# Altium footprint library con-samtec.PCBLIB: 805 footprints (part 41 of 55) (continued)
## TSW-131-02-S-D-RA [mil] (continued)
  rectangle: 890,0 910,170
  rectangle: 990,0 1010,170
  rectangle: 1090,0 1110,170
  rectangle: 1190,0 1210,170
  rectangle: 1290,0 1310,170
  rectangle: 1390,0 1410,170
  rectangle: 1490,0 1510,170

## TSW-131-02-S-Q [mm]
pads (62):
  oct 1.5x1.5 hole 1: 1(38.1,-2.54) 2(38.1,2.54) 3(35.56,-2.54) 4(35.56,2.54) 5(33.02,-2.54) 6(33.02,2.54) 7(30.48,-2.54) 8(30.48,2.54) 9(27.94,-2.54) 10(27.94,2.54) 11(25.4,-2.54) 12(25.4,2.54) 13(22.86,-2.54) 14(22.86,2.54) 15(20.32,-2.54) 16(20.32,2.54) 17(17.78,-2.54) 18(17.78,2.54) 19(15.24,-2.54) 20(15.24,2.54) 21(12.7,-2.54) 22(12.7,2.54) 23(10.16,-2.54) 24(10.16,2.54) 25(7.62,-2.54) 26(7.62,2.54) 27(5.08,-2.54) 28(5.08,2.54) 29(2.54,-2.54) 30(2.54,2.54) 31(0,-2.54) 32(0,2.54) 33(-2.54,-2.54) 34(-2.54,2.54) 35(-5.08,-2.54) 36(-5.08,2.54) 37(-7.62,-2.54) 38(-7.62,2.54) 39(-10.16,-2.54) 40(-10.16,2.54) 41(-12.7,-2.54) 42(-12.7,2.54) 43(-15.24,-2.54) 44(-15.24,2.54) 45(-17.78,-2.54) 46(-17.78,2.54) 47(-20.32,-2.54) 48(-20.32,2.54) 49(-22.86,-2.54) 50(-22.86,2.54) 51(-25.4,-2.54) 52(-25.4,2.54) 53(-27.94,-2.54) 54(-27.94,2.54) 55(-30.48,-2.54) 56(-30.48,2.54) 57(-33.02,-2.54) 58(-33.02,2.54) 59(-35.56,-2.54) 60(-35.56,2.54) 61(-38.1,-2.54) 62(-38.1,2.54)
Top Overlay:
  lines w0.203: -39.499,-3.695 39.499,-3.695 39.499,3.695 -39.499,3.695 -39.499,-3.695
  text "1" at 37.942,-5.138 h0.94
  text "2" at 37.842,3.989 h0.94
Mechanical 16:
  rectangle: -38.45,-2.89 -37.75,-2.19
  rectangle: -38.45,2.19 -37.75,2.89
  rectangle: -35.91,-2.89 -35.21,-2.19
  rectangle: -35.91,2.19 -35.21,2.89
  rectangle: -33.37,-2.89 -32.67,-2.19
  rectangle: -33.37,2.19 -32.67,2.89
  rectangle: -30.83,-2.89 -30.13,-2.19
  rectangle: -30.83,2.19 -30.13,2.89
  rectangle: -28.29,-2.89 -27.59,-2.19
  rectangle: -28.29,2.19 -27.59,2.89
  rectangle: -25.75,-2.89 -25.05,-2.19
  rectangle: -25.75,2.19 -25.05,2.89
  rectangle: -23.21,-2.89 -22.51,-2.19
  rectangle: -23.21,2.19 -22.51,2.89
  rectangle: -20.67,-2.89 -19.97,-2.19
  rectangle: -20.67,2.19 -19.97,2.89
  rectangle: -18.13,-2.89 -17.43,-2.19
  rectangle: -18.13,2.19 -17.43,2.89
  rectangle: -15.59,-2.89 -14.89,-2.19
  rectangle: -15.59,2.19 -14.89,2.89
  rectangle: -13.05,-2.89 -12.35,-2.19
  rectangle: -13.05,2.19 -12.35,2.89
  rectangle: -10.51,-2.89 -9.81,-2.19
  rectangle: -10.51,2.19 -9.81,2.89
  rectangle: -7.97,-2.89 -7.27,-2.19
  rectangle: -7.97,2.19 -7.27,2.89
  rectangle: -5.43,-2.89 -4.73,-2.19
  rectangle: -5.43,2.19 -4.73,2.89
  rectangle: -2.89,-2.89 -2.19,-2.19
  rectangle: -2.89,2.19 -2.19,2.89
  rectangle: -0.35,-2.89 0.35,-2.19
  rectangle: -0.35,2.19 0.35,2.89
  rectangle: 2.19,-2.89 2.89,-2.19
  rectangle: 2.19,2.19 2.89,2.89
  rectangle: 4.73,-2.89 5.43,-2.19
  rectangle: 4.73,2.19 5.43,2.89
  rectangle: 7.27,-2.89 7.97,-2.19
  rectangle: 7.27,2.19 7.97,2.89
  rectangle: 9.81,-2.89 10.51,-2.19
  rectangle: 9.81,2.19 10.51,2.89
  rectangle: 12.35,-2.89 13.05,-2.19
  rectangle: 12.35,2.19 13.05,2.89
  rectangle: 14.89,-2.89 15.59,-2.19
  rectangle: 14.89,2.19 15.59,2.89
  rectangle: 17.43,-2.89 18.13,-2.19
  rectangle: 17.43,2.19 18.13,2.89
  rectangle: 19.97,-2.89 20.67,-2.19
  rectangle: 19.97,2.19 20.67,2.89
  rectangle: 22.51,-2.89 23.21,-2.19
  rectangle: 22.51,2.19 23.21,2.89
  rectangle: 25.05,-2.89 25.75,-2.19
  rectangle: 25.05,2.19 25.75,2.89
  rectangle: 27.59,-2.89 28.29,-2.19
  rectangle: 27.59,2.19 28.29,2.89
  rectangle: 30.13,-2.89 30.83,-2.19
  rectangle: 30.13,2.19 30.83,2.89
  rectangle: 32.67,-2.89 33.37,-2.19
  rectangle: 32.67,2.19 33.37,2.89
  rectangle: 35.21,-2.89 35.91,-2.19
  rectangle: 35.21,2.19 35.91,2.89
  rectangle: 37.75,-2.89 38.45,-2.19
  rectangle: 37.75,2.19 38.45,2.89

## TSW-131-02-S-Q-RA [mil]
pads (62):
  oct 59.06x59.06 hole 39.37: 1(1500,60) 2(1500,260) 3(1400,60) 4(1400,260) 5(1300,60) 6(1300,260) 7(1200,60) 8(1200,260) 9(1100,60) 10(1100,260) 11(1000,60) 12(1000,260) 13(900,60) 14(900,260) 15(800,60) 16(800,260) 17(700,60) 18(700,260) 19(600,60) 20(600,260) 21(500,60) 22(500,260) 23(400,60) 24(400,260) 25(300,60) 26(300,260) 27(200,60) 28(200,260) 29(100,60) 30(100,260) 31(0,60) 32(0,260) 33(-100,60) 34(-100,260) 35(-200,60) 36(-200,260) 37(-300,60) 38(-300,260) 39(-400,60) 40(-400,260) 41(-500,60) 42(-500,260) 43(-600,60) 44(-600,260) 45(-700,60) 46(-700,260) 47(-800,60) 48(-800,260) 49(-900,60) 50(-900,260) 51(-1000,60) 52(-1000,260) 53(-1100,60) 54(-1100,260) 55(-1200,60) 56(-1200,260) 57(-1300,60) 58(-1300,260) 59(-1400,60) 60(-1400,260) 61(-1500,60) 62(-1500,260)
Top Overlay:
  rectangle: -1510,-310.63 -1490,-80.32
  rectangle: -1410,-310.63 -1390,-80.32
  rectangle: -1310,-310.63 -1290,-80.32
  rectangle: -1210,-310.63 -1190,-80.32
  rectangle: -1110,-310.63 -1090,-80.32
  rectangle: -1010,-310.63 -990,-80.32
  rectangle: -910,-310.63 -890,-80.32
  rectangle: -810,-310.63 -790,-80.32
  rectangle: -710,-310.63 -690,-80.32
  rectangle: -610,-310.63 -590,-80.32
  rectangle: -510,-310.63 -490,-80.32
  rectangle: -410,-310.63 -390,-80.32
  rectangle: -310,-310.63 -290,-80.32
  rectangle: -210,-310.63 -190,-80.32
  rectangle: -110,-310.63 -90,-80.32
  rectangle: -10,-310.63 10,-80.32
  rectangle: 90,-310.63 110,-80.32
  rectangle: 190,-310.63 210,-80.32
  rectangle: 290,-310.63 310,-80.32
  rectangle: 390,-310.63 410,-80.32
  rectangle: 490,-310.63 510,-80.32
  rectangle: 590,-310.63 610,-80.32
  rectangle: 690,-310.63 710,-80.32
  rectangle: 790,-310.63 810,-80.32
  rectangle: 890,-310.63 910,-80.32
  rectangle: 990,-310.63 1010,-80.32
  rectangle: 1090,-310.63 1110,-80.32
  rectangle: 1190,-310.63 1210,-80.32
  rectangle: 1290,-310.63 1310,-80.32
  rectangle: 1390,-310.63 1410,-80.32
  rectangle: 1490,-310.63 1510,-80.32
  lines w8: -1555.08,-80.55 1555.08,-80.55 1555.08,-4.17 -1555.08,-4.17 -1555.08,-80.55
  text "1" at 1553.54,43.31 h36.81
  text "2" at 1551.18,242.72 h36.81
Mechanical 16:
  rectangle: -1510,0 -1490,270
  rectangle: -1410,0 -1390,270
  rectangle: -1310,0 -1290,270
  rectangle: -1210,0 -1190,270
  rectangle: -1110,0 -1090,270
  rectangle: -1010,0 -990,270
  rectangle: -910,0 -890,270
  rectangle: -810,0 -790,270
  rectangle: -710,0 -690,270
  rectangle: -610,0 -590,270
  rectangle: -510,0 -490,270
  rectangle: -410,0 -390,270
  rectangle: -310,0 -290,270
  rectangle: -210,0 -190,270
  rectangle: -110,0 -90,270
  rectangle: -10,0 10,270
  rectangle: 90,0 110,270
  rectangle: 190,0 210,270
  rectangle: 290,0 310,270
  rectangle: 390,0 410,270
  rectangle: 490,0 510,270
  rectangle: 590,0 610,270
  rectangle: 690,0 710,270
  rectangle: 790,0 810,270
  rectangle: 890,0 910,270
  rectangle: 990,0 1010,270
  rectangle: 1090,0 1110,270
  rectangle: 1190,0 1210,270
  rectangle: 1290,0 1310,270
  rectangle: 1390,0 1410,270
  rectangle: 1490,0 1510,270

## TSW-131-02-S-S [mm]
pads (31):
  oct 1.5x1.5 hole 1: 1(38.1,0) 2(35.56,0) 3(33.02,0) 4(30.48,0) 5(27.94,0) 6(25.4,0) 7(22.86,0) 8(20.32,0) 9(17.78,0) 10(15.24,0) 11(12.7,0) 12(10.16,0) 13(7.62,0) 14(5.08,0) 15(2.54,0) 16(0,0) 17(-2.54,0) 18(-5.08,0) 19(-7.62,0) 20(-10.16,0) 21(-12.7,0) 22(-15.24,0) 23(-17.78,0) 24(-20.32,0) 25(-22.86,0) 26(-25.4,0) 27(-27.94,0) 28(-30.48,0) 29(-33.02,0) 30(-35.56,0) 31(-38.1,0)
Top Overlay:
  lines w0.203: -39.499,-1.155 39.499,-1.155 39.499,1.155 -39.499,1.155 -39.499,-1.155
  text "1" at 37.842,-2.498 h0.94
Mechanical 16:
  rectangle: -38.45,-0.35 -37.75,0.35
  rectangle: -35.91,-0.35 -35.21,0.35
  rectangle: -33.37,-0.35 -32.67,0.35
  rectangle: -30.83,-0.35 -30.13,0.35
  rectangle: -28.29,-0.35 -27.59,0.35
  rectangle: -25.75,-0.35 -25.05,0.35
  rectangle: -23.21,-0.35 -22.51,0.35
  rectangle: -20.67,-0.35 -19.97,0.35
  rectangle: -18.13,-0.35 -17.43,0.35
  rectangle: -15.59,-0.35 -14.89,0.35
  rectangle: -13.05,-0.35 -12.35,0.35
  rectangle: -10.51,-0.35 -9.81,0.35
  rectangle: -7.97,-0.35 -7.27,0.35
  rectangle: -5.43,-0.35 -4.73,0.35
  rectangle: -2.89,-0.35 -2.19,0.35
  rectangle: -0.35,-0.35 0.35,0.35
  rectangle: 2.19,-0.35 2.89,0.35
  rectangle: 4.73,-0.35 5.43,0.35
  rectangle: 7.27,-0.35 7.97,0.35
  rectangle: 9.81,-0.35 10.51,0.35
  rectangle: 12.35,-0.35 13.05,0.35
  rectangle: 14.89,-0.35 15.59,0.35
  rectangle: 17.43,-0.35 18.13,0.35
  rectangle: 19.97,-0.35 20.67,0.35
  rectangle: 22.51,-0.35 23.21,0.35
  rectangle: 25.05,-0.35 25.75,0.35
  rectangle: 27.59,-0.35 28.29,0.35
  rectangle: 30.13,-0.35 30.83,0.35
  rectangle: 32.67,-0.35 33.37,0.35
  rectangle: 35.21,-0.35 35.91,0.35
  rectangle: 37.75,-0.35 38.45,0.35

## TSW-131-02-S-S-RA [mil]
pads (31):
  oct 59.06x59.06 hole 39.37: 1(1500,60) 2(1400,60) 3(1300,60) 4(1200,60) 5(1100,60) 6(1000,60) 7(900,60) 8(800,60) 9(700,60) 10(600,60) 11(500,60) 12(400,60) 13(300,60) 14(200,60) 15(100,60) 16(0,60) 17(-100,60) 18(-200,60) 19(-300,60) 20(-400,60) 21(-500,60) 22(-600,60) 23(-700,60) 24(-800,60) 25(-900,60) 26(-1000,60) 27(-1100,60) 28(-1200,60) 29(-1300,60) 30(-1400,60) 31(-1500,60)
Top Overlay:
  rectangle: -1510,-310.63 -1490,-80.32
  rectangle: -1410,-310.63 -1390,-80.32
  rectangle: -1310,-310.63 -1290,-80.32
  rectangle: -1210,-310.63 -1190,-80.32
  rectangle: -1110,-310.63 -1090,-80.32
  rectangle: -1010,-310.63 -990,-80.32
  rectangle: -910,-310.63 -890,-80.32
  rectangle: -810,-310.63 -790,-80.32
  rectangle: -710,-310.63 -690,-80.32
  rectangle: -610,-310.63 -590,-80.32
  rectangle: -510,-310.63 -490,-80.32
  rectangle: -410,-310.63 -390,-80.32
  rectangle: -310,-310.63 -290,-80.32
  rectangle: -210,-310.63 -190,-80.32
  rectangle: -110,-310.63 -90,-80.32
  rectangle: -10,-310.63 10,-80.32
  rectangle: 90,-310.63 110,-80.32
  rectangle: 190,-310.63 210,-80.32
  rectangle: 290,-310.63 310,-80.32
  rectangle: 390,-310.63 410,-80.32
  rectangle: 490,-310.63 510,-80.32
  rectangle: 590,-310.63 610,-80.32
  rectangle: 690,-310.63 710,-80.32
  rectangle: 790,-310.63 810,-80.32
  rectangle: 890,-310.63 910,-80.32
  rectangle: 990,-310.63 1010,-80.32
  rectangle: 1090,-310.63 1110,-80.32
  rectangle: 1190,-310.63 1210,-80.32
  rectangle: 1290,-310.63 1310,-80.32
  rectangle: 1390,-310.63 1410,-80.32
  rectangle: 1490,-310.63 1510,-80.32
  lines w8: -1555.08,-80.55 1555.08,-80.55 1555.08,-4.17 -1555.08,-4.17 -1555.08,-80.55
  text "1" at 1550.47,45.35 h36.81
Mechanical 16:
  rectangle: -1510,0 -1490,70
  rectangle: -1410,0 -1390,70
  rectangle: -1310,0 -1290,70
  rectangle: -1210,0 -1190,70
  rectangle: -1110,0 -1090,70
  rectangle: -1010,0 -990,70
  rectangle: -910,0 -890,70
  rectangle: -810,0 -790,70
  rectangle: -710,0 -690,70
  rectangle: -610,0 -590,70
  rectangle: -510,0 -490,70
  rectangle: -410,0 -390,70
  rectangle: -310,0 -290,70
  rectangle: -210,0 -190,70
  rectangle: -110,0 -90,70
  rectangle: -10,0 10,70
  rectangle: 90,0 110,70
  rectangle: 190,0 210,70
  rectangle: 290,0 310,70
  rectangle: 390,0 410,70
  rectangle: 490,0 510,70
  rectangle: 590,0 610,70
  rectangle: 690,0 710,70
  rectangle: 790,0 810,70
  rectangle: 890,0 910,70
  rectangle: 990,0 1010,70
  rectangle: 1090,0 1110,70
  rectangle: 1190,0 1210,70
  rectangle: 1290,0 1310,70
  rectangle: 1390,0 1410,70
  rectangle: 1490,0 1510,70

## TSW-131-02-S-T [mm]
pads (93):
  oct 1.5x1.5 hole 1: 1(38.1,-2.54) 2(38.1,0) 3(38.1,2.54) 4(35.56,-2.54) 5(35.56,0) 6(35.56,2.54) 7(33.02,-2.54) 8(33.02,0) 9(33.02,2.54) 10(30.48,-2.54) 11(30.48,0) 12(30.48,2.54) 13(27.94,-2.54) 14(27.94,0) 15(27.94,2.54) 16(25.4,-2.54) 17(25.4,0) 18(25.4,2.54) 19(22.86,-2.54) 20(22.86,0) 21(22.86,2.54) 22(20.32,-2.54) 23(20.32,0) 24(20.32,2.54) 25(17.78,-2.54) 26(17.78,0) 27(17.78,2.54) 28(15.24,-2.54) 29(15.24,0) 30(15.24,2.54) 31(12.7,-2.54) 32(12.7,0) 33(12.7,2.54) 34(10.16,-2.54) 35(10.16,0) 36(10.16,2.54) 37(7.62,-2.54) 38(7.62,0) 39(7.62,2.54) 40(5.08,-2.54) 41(5.08,0) 42(5.08,2.54) 43(2.54,-2.54) 44(2.54,0) 45(2.54,2.54) 46(0,-2.54) 47(0,0) 48(0,2.54) 49(-2.54,-2.54) 50(-2.54,0) 51(-2.54,2.54) 52(-5.08,-2.54) 53(-5.08,0) 54(-5.08,2.54) 55(-7.62,-2.54) 56(-7.62,0) 57(-7.62,2.54) 58(-10.16,-2.54) 59(-10.16,0) 60(-10.16,2.54) 61(-12.7,-2.54) 62(-12.7,0) 63(-12.7,2.54) 64(-15.24,-2.54) 65(-15.24,0) 66(-15.24,2.54) 67(-17.78,-2.54) 68(-17.78,0) 69(-17.78,2.54) 70(-20.32,-2.54) 71(-20.32,0) 72(-20.32,2.54) 73(-22.86,-2.54) 74(-22.86,0) 75(-22.86,2.54) 76(-25.4,-2.54) 77(-25.4,0) 78(-25.4,2.54) 79(-27.94,-2.54) 80(-27.94,0) 81(-27.94,2.54) 82(-30.48,-2.54) 83(-30.48,0) 84(-30.48,2.54) 85(-33.02,-2.54) 86(-33.02,0) 87(-33.02,2.54) 88(-35.56,-2.54) 89(-35.56,0) 90(-35.56,2.54) 91(-38.1,-2.54) 92(-38.1,0) 93(-38.1,2.54)
Top Overlay:
  lines w0.203: -39.499,-3.695 39.499,-3.695 39.499,3.695 -39.499,3.695 -39.499,-3.695
  text "1" at 37.792,-5.188 h0.94
  text "3" at 37.788,3.989 h0.94
Mechanical 16:
  rectangle: -38.45,-2.89 -37.75,-2.19
  rectangle: -38.45,-0.35 -37.75,0.35
  rectangle: -38.45,2.19 -37.75,2.89
  rectangle: -35.91,-2.89 -35.21,-2.19
  rectangle: -35.91,-0.35 -35.21,0.35
  rectangle: -35.91,2.19 -35.21,2.89
  rectangle: -33.37,-2.89 -32.67,-2.19
  rectangle: -33.37,-0.35 -32.67,0.35
  rectangle: -33.37,2.19 -32.67,2.89
  rectangle: -30.83,-2.89 -30.13,-2.19
  rectangle: -30.83,-0.35 -30.13,0.35
  rectangle: -30.83,2.19 -30.13,2.89
  rectangle: -28.29,-2.89 -27.59,-2.19
  rectangle: -28.29,-0.35 -27.59,0.35
  rectangle: -28.29,2.19 -27.59,2.89
  rectangle: -25.75,-2.89 -25.05,-2.19
  rectangle: -25.75,-0.35 -25.05,0.35
  rectangle: -25.75,2.19 -25.05,2.89
  rectangle: -23.21,-2.89 -22.51,-2.19
  rectangle: -23.21,-0.35 -22.51,0.35
  rectangle: -23.21,2.19 -22.51,2.89
  rectangle: -20.67,-2.89 -19.97,-2.19
  rectangle: -20.67,-0.35 -19.97,0.35
  rectangle: -20.67,2.19 -19.97,2.89
  rectangle: -18.13,-2.89 -17.43,-2.19
  rectangle: -18.13,-0.35 -17.43,0.35
  rectangle: -18.13,2.19 -17.43,2.89
  rectangle: -15.59,-2.89 -14.89,-2.19
  rectangle: -15.59,-0.35 -14.89,0.35
  rectangle: -15.59,2.19 -14.89,2.89
  rectangle: -13.05,-2.89 -12.35,-2.19
  rectangle: -13.05,-0.35 -12.35,0.35
  rectangle: -13.05,2.19 -12.35,2.89
  rectangle: -10.51,-2.89 -9.81,-2.19
  rectangle: -10.51,-0.35 -9.81,0.35
  rectangle: -10.51,2.19 -9.81,2.89
  rectangle: -7.97,-2.89 -7.27,-2.19
  rectangle: -7.97,-0.35 -7.27,0.35
  rectangle: -7.97,2.19 -7.27,2.89
  rectangle: -5.43,-2.89 -4.73,-2.19
  rectangle: -5.43,-0.35 -4.73,0.35
  rectangle: -5.43,2.19 -4.73,2.89
  rectangle: -2.89,-2.89 -2.19,-2.19
  rectangle: -2.89,-0.35 -2.19,0.35
  rectangle: -2.89,2.19 -2.19,2.89
  rectangle: -0.35,-2.89 0.35,-2.19
  rectangle: -0.35,-0.35 0.35,0.35
  rectangle: -0.35,2.19 0.35,2.89
  rectangle: 2.19,-2.89 2.89,-2.19
  rectangle: 2.19,-0.35 2.89,0.35
  rectangle: 2.19,2.19 2.89,2.89
  rectangle: 4.73,-2.89 5.43,-2.19
  rectangle: 4.73,-0.35 5.43,0.35
  rectangle: 4.73,2.19 5.43,2.89
  rectangle: 7.27,-2.89 7.97,-2.19
  rectangle: 7.27,-0.35 7.97,0.35
  rectangle: 7.27,2.19 7.97,2.89
  rectangle: 9.81,-2.89 10.51,-2.19
  rectangle: 9.81,-0.35 10.51,0.35
  rectangle: 9.81,2.19 10.51,2.89
  rectangle: 12.35,-2.89 13.05,-2.19
  rectangle: 12.35,-0.35 13.05,0.35
  rectangle: 12.35,2.19 13.05,2.89
  rectangle: 14.89,-2.89 15.59,-2.19
  rectangle: 14.89,-0.35 15.59,0.35
  rectangle: 14.89,2.19 15.59,2.89
  rectangle: 17.43,-2.89 18.13,-2.19
  rectangle: 17.43,-0.35 18.13,0.35
  rectangle: 17.43,2.19 18.13,2.89
  rectangle: 19.97,-2.89 20.67,-2.19
  rectangle: 19.97,-0.35 20.67,0.35
  rectangle: 19.97,2.19 20.67,2.89
  rectangle: 22.51,-2.89 23.21,-2.19
  rectangle: 22.51,-0.35 23.21,0.35
  rectangle: 22.51,2.19 23.21,2.89
  rectangle: 25.05,-2.89 25.75,-2.19
  rectangle: 25.05,-0.35 25.75,0.35
  rectangle: 25.05,2.19 25.75,2.89
  rectangle: 27.59,-2.89 28.29,-2.19
  rectangle: 27.59,-0.35 28.29,0.35
  rectangle: 27.59,2.19 28.29,2.89
  rectangle: 30.13,-2.89 30.83,-2.19
  rectangle: 30.13,-0.35 30.83,0.35
  rectangle: 30.13,2.19 30.83,2.89
  rectangle: 32.67,-2.89 33.37,-2.19
  rectangle: 32.67,-0.35 33.37,0.35
  rectangle: 32.67,2.19 33.37,2.89
  rectangle: 35.21,-2.89 35.91,-2.19
  rectangle: 35.21,-0.35 35.91,0.35
  rectangle: 35.21,2.19 35.91,2.89
  rectangle: 37.75,-2.89 38.45,-2.19
  rectangle: 37.75,-0.35 38.45,0.35
  rectangle: 37.75,2.19 38.45,2.89

## TSW-131-02-S-T-RA [mil]
pads (93):
  oct 59.06x59.06 hole 39.37: 1(1500,60) 2(1500,160) 3(1500,260) 4(1400,60) 5(1400,160) 6(1400,260) 7(1300,60) 8(1300,160) 9(1300,260) 10(1200,60) 11(1200,160) 12(1200,260) 13(1100,60) 14(1100,160) 15(1100,260) 16(1000,60) 17(1000,160) 18(1000,260) 19(900,60) 20(900,160) 21(900,260) 22(800,60) 23(800,160) 24(800,260) 25(700,60) 26(700,160) 27(700,260) 28(600,60) 29(600,160) 30(600,260) 31(500,60) 32(500,160) 33(500,260) 34(400,60) 35(400,160) 36(400,260) 37(300,60) 38(300,160) 39(300,260) 40(200,60) 41(200,160) 42(200,260) 43(100,60) 44(100,160) 45(100,260) 46(0,60) 47(0,160) 48(0,260) 49(-100,60) 50(-100,160) 51(-100,260) 52(-200,60) 53(-200,160) 54(-200,260) 55(-300,60) 56(-300,160) 57(-300,260) 58(-400,60) 59(-400,160) 60(-400,260) 61(-500,60) 62(-500,160) 63(-500,260) 64(-600,60) 65(-600,160) 66(-600,260) 67(-700,60) 68(-700,160) 69(-700,260) 70(-800,60) 71(-800,160) 72(-800,260) 73(-900,60) 74(-900,160) 75(-900,260) 76(-1000,60) 77(-1000,160) 78(-1000,260) 79(-1100,60) 80(-1100,160) 81(-1100,260) 82(-1200,60) 83(-1200,160) 84(-1200,260) 85(-1300,60) 86(-1300,160) 87(-1300,260) 88(-1400,60) 89(-1400,160) 90(-1400,260) 91(-1500,60) 92(-1500,160) 93(-1500,260)
Top Overlay:
  rectangle: -1510,-310.63 -1490,-80.32
  rectangle: -1410,-310.63 -1390,-80.32
  rectangle: -1310,-310.63 -1290,-80.32
  rectangle: -1210,-310.63 -1190,-80.32
  rectangle: -1110,-310.63 -1090,-80.32
  rectangle: -1010,-310.63 -990,-80.32
  rectangle: -910,-310.63 -890,-80.32
  rectangle: -810,-310.63 -790,-80.32
  rectangle: -710,-310.63 -690,-80.32
  rectangle: -610,-310.63 -590,-80.32
  rectangle: -510,-310.63 -490,-80.32
  rectangle: -410,-310.63 -390,-80.32
  rectangle: -310,-310.63 -290,-80.32
  rectangle: -210,-310.63 -190,-80.32
  rectangle: -110,-310.63 -90,-80.32
  rectangle: -10,-310.63 10,-80.32
  rectangle: 90,-310.63 110,-80.32
  rectangle: 190,-310.63 210,-80.32
  rectangle: 290,-310.63 310,-80.32
  rectangle: 390,-310.63 410,-80.32
  rectangle: 490,-310.63 510,-80.32
  rectangle: 590,-310.63 610,-80.32
  rectangle: 690,-310.63 710,-80.32
  rectangle: 790,-310.63 810,-80.32
  rectangle: 890,-310.63 910,-80.32
  rectangle: 990,-310.63 1010,-80.32
  rectangle: 1090,-310.63 1110,-80.32
  rectangle: 1190,-310.63 1210,-80.32
  rectangle: 1290,-310.63 1310,-80.32
  rectangle: 1390,-310.63 1410,-80.32
  rectangle: 1490,-310.63 1510,-80.32
  lines w8: -1555.08,-80.55 1555.08,-80.55 1555.08,-4.17 -1555.08,-4.17 -1555.08,-80.55
  text "1" at 1551.57,41.34 h36.81
  text "3" at 1552.17,236.81 h36.81
Mechanical 16:
  rectangle: -1510,0 -1490,270
  rectangle: -1410,0 -1390,270
  rectangle: -1310,0 -1290,270
  rectangle: -1210,0 -1190,270
  rectangle: -1110,0 -1090,270
  rectangle: -1010,0 -990,270
  rectangle: -910,0 -890,270
  rectangle: -810,0 -790,270
  rectangle: -710,0 -690,270
  rectangle: -610,0 -590,270
  rectangle: -510,0 -490,270
  rectangle: -410,0 -390,270
  rectangle: -310,0 -290,270
  rectangle: -210,0 -190,270
  rectangle: -110,0 -90,270
  rectangle: -10,0 10,270
  rectangle: 90,0 110,270
  rectangle: 190,0 210,270
  rectangle: 290,0 310,270
  rectangle: 390,0 410,270
  rectangle: 490,0 510,270
  rectangle: 590,0 610,270
  rectangle: 690,0 710,270
  rectangle: 790,0 810,270
  rectangle: 890,0 910,270
  rectangle: 990,0 1010,270
  rectangle: 1090,0 1110,270
  rectangle: 1190,0 1210,270
  rectangle: 1290,0 1310,270
  rectangle: 1390,0 1410,270
  rectangle: 1490,0 1510,270

## TSW-132-02-S-D [mm]
pads (64):
  oct 1.5x1.5 hole 1: 1(39.37,-1.27) 2(39.37,1.27) 3(36.83,-1.27) 4(36.83,1.27) 5(34.29,-1.27) 6(34.29,1.27) 7(31.75,-1.27) 8(31.75,1.27) 9(29.21,-1.27) 10(29.21,1.27) 11(26.67,-1.27) 12(26.67,1.27) 13(24.13,-1.27) 14(24.13,1.27) 15(21.59,-1.27) 16(21.59,1.27) 17(19.05,-1.27) 18(19.05,1.27) 19(16.51,-1.27) 20(16.51,1.27) 21(13.97,-1.27) 22(13.97,1.27) 23(11.43,-1.27) 24(11.43,1.27) 25(8.89,-1.27) 26(8.89,1.27) 27(6.35,-1.27) 28(6.35,1.27) 29(3.81,-1.27) 30(3.81,1.27) 31(1.27,-1.27) 32(1.27,1.27) 33(-1.27,-1.27) 34(-1.27,1.27) 35(-3.81,-1.27) 36(-3.81,1.27) 37(-6.35,-1.27) 38(-6.35,1.27) 39(-8.89,-1.27) 40(-8.89,1.27) 41(-11.43,-1.27) 42(-11.43,1.27) 43(-13.97,-1.27) 44(-13.97,1.27) 45(-16.51,-1.27) 46(-16.51,1.27) 47(-19.05,-1.27) 48(-19.05,1.27) 49(-21.59,-1.27) 50(-21.59,1.27) 51(-24.13,-1.27) 52(-24.13,1.27) 53(-26.67,-1.27) 54(-26.67,1.27) 55(-29.21,-1.27) 56(-29.21,1.27) 57(-31.75,-1.27) 58(-31.75,1.27) 59(-34.29,-1.27) 60(-34.29,1.27) 61(-36.83,-1.27) 62(-36.83,1.27) 63(-39.37,-1.27) 64(-39.37,1.27)
Top Overlay:
  lines w0.203: -40.769,-2.425 40.769,-2.425 40.769,2.425 -40.769,2.425 -40.769,-2.425
  text "1" at 39.162,-3.818 h0.94
  text "2" at 38.987,2.744 h0.94
Mechanical 16:
  rectangle: -39.72,-1.62 -39.02,-0.92
  rectangle: -39.72,0.92 -39.02,1.62
  rectangle: -37.18,-1.62 -36.48,-0.92
  rectangle: -37.18,0.92 -36.48,1.62
  rectangle: -34.64,-1.62 -33.94,-0.92
  rectangle: -34.64,0.92 -33.94,1.62
  rectangle: -32.1,-1.62 -31.4,-0.92
  rectangle: -32.1,0.92 -31.4,1.62
  rectangle: -29.56,-1.62 -28.86,-0.92
  rectangle: -29.56,0.92 -28.86,1.62
  rectangle: -27.02,-1.62 -26.32,-0.92
  rectangle: -27.02,0.92 -26.32,1.62
  rectangle: -24.48,-1.62 -23.78,-0.92
  rectangle: -24.48,0.92 -23.78,1.62
  rectangle: -21.94,-1.62 -21.24,-0.92
  rectangle: -21.94,0.92 -21.24,1.62
  rectangle: -19.4,-1.62 -18.7,-0.92
  rectangle: -19.4,0.92 -18.7,1.62
  rectangle: -16.86,-1.62 -16.16,-0.92
  rectangle: -16.86,0.92 -16.16,1.62
  rectangle: -14.32,-1.62 -13.62,-0.92
  rectangle: -14.32,0.92 -13.62,1.62
  rectangle: -11.78,-1.62 -11.08,-0.92
  rectangle: -11.78,0.92 -11.08,1.62
  rectangle: -9.24,-1.62 -8.54,-0.92
  rectangle: -9.24,0.92 -8.54,1.62
  rectangle: -6.7,-1.62 -6,-0.92
  rectangle: -6.7,0.92 -6,1.62
  rectangle: -4.16,-1.62 -3.46,-0.92
  rectangle: -4.16,0.92 -3.46,1.62
  rectangle: -1.62,-1.62 -0.92,-0.92
  rectangle: -1.62,0.92 -0.92,1.62
  rectangle: 0.92,-1.62 1.62,-0.92
  rectangle: 0.92,0.92 1.62,1.62
  rectangle: 3.46,-1.62 4.16,-0.92
  rectangle: 3.46,0.92 4.16,1.62
  rectangle: 6,-1.62 6.7,-0.92
  rectangle: 6,0.92 6.7,1.62
  rectangle: 8.54,-1.62 9.24,-0.92
  rectangle: 8.54,0.92 9.24,1.62
  rectangle: 11.08,-1.62 11.78,-0.92
  rectangle: 11.08,0.92 11.78,1.62
  rectangle: 13.62,-1.62 14.32,-0.92
  rectangle: 13.62,0.92 14.32,1.62
  rectangle: 16.16,-1.62 16.86,-0.92
  rectangle: 16.16,0.92 16.86,1.62
  rectangle: 18.7,-1.62 19.4,-0.92
  rectangle: 18.7,0.92 19.4,1.62
  rectangle: 21.24,-1.62 21.94,-0.92
  rectangle: 21.24,0.92 21.94,1.62
  rectangle: 23.78,-1.62 24.48,-0.92
  rectangle: 23.78,0.92 24.48,1.62
  rectangle: 26.32,-1.62 27.02,-0.92
  rectangle: 26.32,0.92 27.02,1.62
  rectangle: 28.86,-1.62 29.56,-0.92
  rectangle: 28.86,0.92 29.56,1.62
  rectangle: 31.4,-1.62 32.1,-0.92
  rectangle: 31.4,0.92 32.1,1.62
  rectangle: 33.94,-1.62 34.64,-0.92
  rectangle: 33.94,0.92 34.64,1.62
  rectangle: 36.48,-1.62 37.18,-0.92
  rectangle: 36.48,0.92 37.18,1.62
  rectangle: 39.02,-1.62 39.72,-0.92
  rectangle: 39.02,0.92 39.72,1.62

## TSW-132-02-S-D-RA [mil]
pads (64):
  oct 59.06x59.06 hole 39.37: 1(1550,60) 2(1550,160) 3(1450,60) 4(1450,160) 5(1350,60) 6(1350,160) 7(1250,60) 8(1250,160) 9(1150,60) 10(1150,160) 11(1050,60) 12(1050,160) 13(950,60) 14(950,160) 15(850,60) 16(850,160) 17(750,60) 18(750,160) 19(650,60) 20(650,160) 21(550,60) 22(550,160) 23(450,60) 24(450,160) 25(350,60) 26(350,160) 27(250,60) 28(250,160) 29(150,60) 30(150,160) 31(50,60) 32(50,160) 33(-50,60) 34(-50,160) 35(-150,60) 36(-150,160) 37(-250,60) 38(-250,160) 39(-350,60) 40(-350,160) 41(-450,60) 42(-450,160) 43(-550,60) 44(-550,160) 45(-650,60) 46(-650,160) 47(-750,60) 48(-750,160) 49(-850,60) 50(-850,160) 51(-950,60) 52(-950,160) 53(-1050,60) 54(-1050,160) 55(-1150,60) 56(-1150,160) 57(-1250,60) 58(-1250,160) 59(-1350,60) 60(-1350,160) 61(-1450,60) 62(-1450,160) 63(-1550,60) 64(-1550,160)
Top Overlay:
  rectangle: -1560,-310.63 -1540,-80.32
  rectangle: -1460,-310.63 -1440,-80.32
  rectangle: -1360,-310.63 -1340,-80.32
  rectangle: -1260,-310.63 -1240,-80.32
  rectangle: -1160,-310.63 -1140,-80.32
  rectangle: -1060,-310.63 -1040,-80.32
  rectangle: -960,-310.63 -940,-80.32
  rectangle: -860,-310.63 -840,-80.32
  rectangle: -760,-310.63 -740,-80.32
  rectangle: -660,-310.63 -640,-80.32
  rectangle: -560,-310.63 -540,-80.32
  rectangle: -460,-310.63 -440,-80.32
  rectangle: -360,-310.63 -340,-80.32
  rectangle: -260,-310.63 -240,-80.32
  rectangle: -160,-310.63 -140,-80.32
  rectangle: -60,-310.63 -40,-80.32
  rectangle: 40,-310.63 60,-80.32
  rectangle: 140,-310.63 160,-80.32
  rectangle: 240,-310.63 260,-80.32
  rectangle: 340,-310.63 360,-80.32
  rectangle: 440,-310.63 460,-80.32
  rectangle: 540,-310.63 560,-80.32
  rectangle: 640,-310.63 660,-80.32
  rectangle: 740,-310.63 760,-80.32
  rectangle: 840,-310.63 860,-80.32
  rectangle: 940,-310.63 960,-80.32
  rectangle: 1040,-310.63 1060,-80.32
  rectangle: 1140,-310.63 1160,-80.32
  rectangle: 1240,-310.63 1260,-80.32
  rectangle: 1340,-310.63 1360,-80.32
  rectangle: 1440,-310.63 1460,-80.32
  rectangle: 1540,-310.63 1560,-80.32
  lines w8: -1605.08,-80.55 1605.08,-80.55 1605.08,-4.17 -1605.08,-4.17 -1605.08,-80.55
  text "1" at 1600.59,30.51 h36.81
  text "2" at 1599.21,129.53 h36.81
Mechanical 16:
  rectangle: -1560,0 -1540,170
  rectangle: -1460,0 -1440,170
  rectangle: -1360,0 -1340,170
  rectangle: -1260,0 -1240,170
  rectangle: -1160,0 -1140,170
  rectangle: -1060,0 -1040,170
  rectangle: -960,0 -940,170
  rectangle: -860,0 -840,170
  rectangle: -760,0 -740,170
  rectangle: -660,0 -640,170
  rectangle: -560,0 -540,170
  rectangle: -460,0 -440,170
  rectangle: -360,0 -340,170
  rectangle: -260,0 -240,170
  rectangle: -160,0 -140,170
  rectangle: -60,0 -40,170
  rectangle: 40,0 60,170
  rectangle: 140,0 160,170
  rectangle: 240,0 260,170
  rectangle: 340,0 360,170
  rectangle: 440,0 460,170
  rectangle: 540,0 560,170
  rectangle: 640,0 660,170
  rectangle: 740,0 760,170
  rectangle: 840,0 860,170
  rectangle: 940,0 960,170
  rectangle: 1040,0 1060,170
  rectangle: 1140,0 1160,170
  rectangle: 1240,0 1260,170
  rectangle: 1340,0 1360,170
  rectangle: 1440,0 1460,170
  rectangle: 1540,0 1560,170